# Altium footprint library User.PcbLib: 317 footprints (part 15 of 20)
Each footprint in its own frame and in the unit in brackets; x right, y up, seen from the top. Pads: shape width x height; smd on the part's side, far side on the other; paste and mask are expansions set on the pad; w line width, h text height; cw(c..) or ccw(c..) is an arc to the next point about the centre after c.
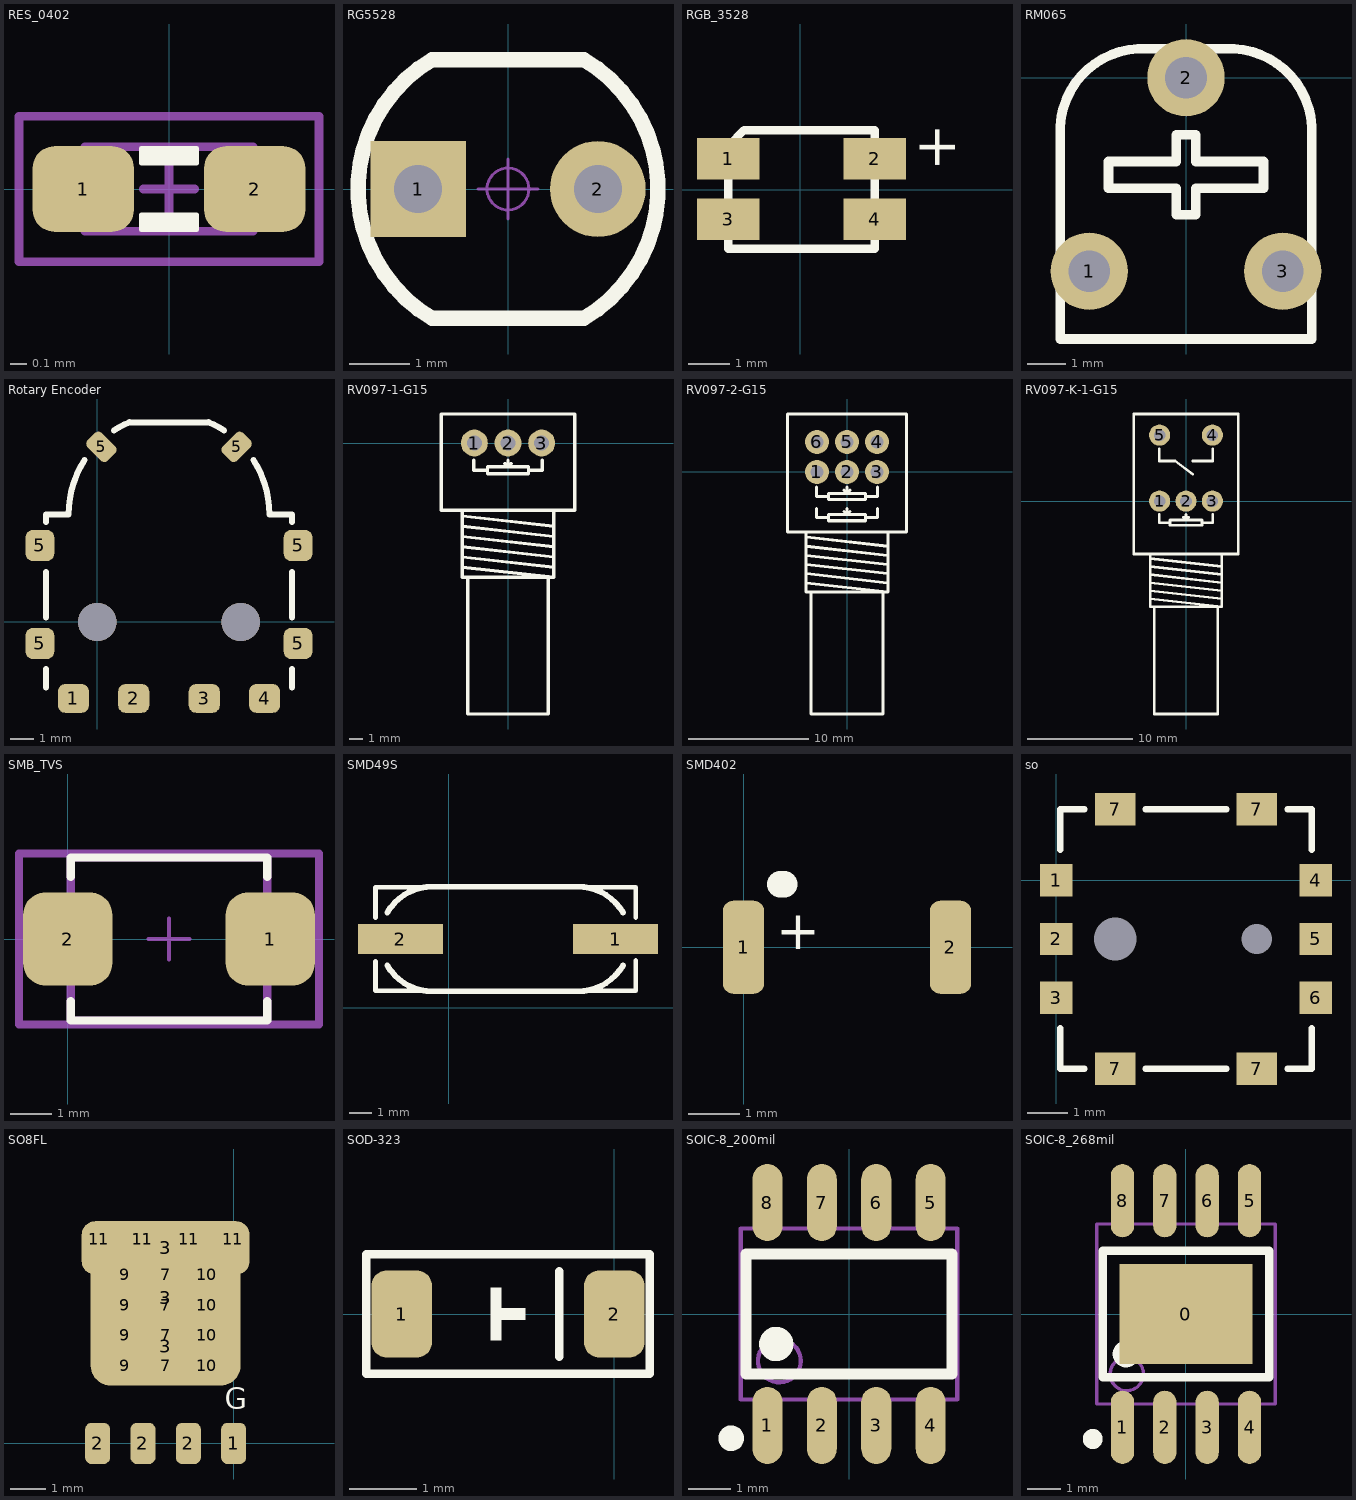
[diagram p14: the footprints below, top view; thin cyan lines are the x and y axes]

## RES_0402 [mil]
pads (2):
  rrect50% 23.62x20 smd: 1(-20,0) 2(20,0)
Top Overlay:
  region: -6.5,9.5 6.5,9.5 6.5,6 -6.5,6
  region: 6.5,-9.5 -6.5,-9.5 -6.5,-6 6.5,-6
  lines w1: -6.5,-9.5 -6.5,-6 6.5,-6 6.5,-9.5 -6.5,-9.5 ; -6.5,6 6.5,6 6.5,9.5 -6.5,9.5 -6.5,6
Mechanical 13:
  lines w2: -6,0 6,0 ; 0,-6 0,6 ; -19.69,-9.84 19.68,-9.84 19.68,9.84 -19.69,9.84 -19.69,-9.84
Mechanical 14:
  lines w2: -35,-17 -35,17 35,17 35,-17 -35,-17
3D body "RESC1005X03L.step": height 13.78, standoff 0, extent -19.68,-9.84 19.69,9.85

## RG5528 [mm] "LIght"
pads (2):
  rect 1.6x1.6 hole 0.8: 1(-1.5,0)
  round 1.6 hole 0.8: 2(1.5,0)
Top Overlay:
  lines w0.254: -1.27,-2.159 cw(c0,0) -1.27,2.159 1.27,2.159 cw(c0,0) 1.27,-2.159 -1.27,-2.159
Mechanical 15:
  circle w0.05: c0,0 r0.35
  lines w0.05: -0.5,0 0.5,0 ; 0,-0.5 0,0.5
3D body "RG5528.STEP": height 4.9, standoff -0.45, extent -2.5,-2.15 2.5,2.15

## RGB_3528 [mm]
pads (4):
  rect 1.5x1 smd: 1(-1.727,0.737) 2(1.778,0.737) 3(-1.727,-0.711) 4(1.778,-0.711)
Top Overlay:
  lines w0.2: -1.727,-1.422 1.778,-1.422 1.778,1.422 -1.346,1.422 -1.727,1.041 -1.727,-1.422
  text "+" at 3.709,0.436 h1
Mechanical 2:
  text "+" at 0.534,-0.33 h1
3D body "LED3528.step": height 1.8, standoff 0, extent -1.75,-1.4 1.75,1.4

## RM065 [mil] "蓝白可调电位器"
pads (3):
  round 80 hole 43.31: 1(-100,-200) 2(0,0) 3(100,-200)
Top Overlay:
  lines w10: -130,-270 130,-270 130,-50 ccw(c45,-55) 40,30 -40,30 ccw(c-45,-55) -130,-50 -130,-270 ; -80,-114.17 -80,-86.61 -10,-86.61 -10,-70 -10,-59.06 10,-59.06 10,-86.61 80,-86.61 80,-114.17 10,-114.17 10,-141.73 -10,-141.73 -10,-114.17 -80,-114.17
3D body "RM065.STEP": height 299.21, standoff -137.8, extent -127.95,-268.83 127.96,29.59

## Rotary Encoder [mm]
pads (10):
  rrect50% 1.3x1.2 smd: 1(-1,-3.2) 2(1.525,-3.2) 3(4.475,-3.2) 4(7,-3.2)
  rrect50% 1.2x1.3 smd: 5(-2.4,-0.9) 5(-2.4,3.2) 5(8.4,-0.9) 5(8.4,3.2)
  rrect50% 0.85x1.2 smd rot 45: 5(0.172,7.328)
  rrect50% 0.85x1.2 smd rot 135: 5(5.828,7.328)
via 0,0 diameter 1.6 hole 1.6
via 6,0 diameter 1.6 hole 1.6
Top Overlay:
  lines w0.254: -2.15,-2.75 -2.15,-1.977 ; -2.15,0.182 -2.15,2.098 ; -2.15,4.176 -2.15,4.5 -1.2,4.5 cw(c3,4.5) -0.533,6.771 ; 0.702,8.015 cw(c3,4.5) 1.345,8.36 ; 1.345,8.35 4.655,8.35 ; 4.655,8.36 cw(c3,4.5) 5.298,8.015 ; 6.533,6.771 cw(c3,4.5) 7.2,4.5 8.15,4.5 8.15,4.176 ; 8.15,-2.75 8.15,-1.977 ; 8.15,0.182 8.15,2.098
3D body "RE.step": height 4.06, standoff -0.44, extent -4.199,-3 10.199,11.75

## RV097-1-G15 [mm] "单路"
pads (3):
  round 2 hole 1.1: 1(-2.5,0) 2(0,0) 3(2.5,0)
Top Overlay:
  lines w0.254: -3.4,-9.238 3.4,-10 ; -3.4,-8.476 3.4,-9.238 ; -3.4,-7.714 3.4,-8.476 ; -3.4,-6.952 3.4,-7.714 ; -3.4,-6.19 3.4,-6.952 ; -3.4,-5.428 3.4,-6.19 ; -3.4,-5 -3.4,-10 3.4,-10 ; -3,-10 -3,-20.16 3,-20.16 3,-10 ; -2.54,-1.27 -2.54,-2.032 -1.524,-2.032 ; -0.254,-1.524 0,-1.778 ; 0,-1.27 0,-1.778 ; 0.254,-1.524 0,-1.778 ; 1.524,-2.032 2.54,-2.032 2.54,-1.27 ; 3.4,-5 3.4,-10 ; -4.953,-5 -4.953,2.159 4.953,2.159 4.953,-5 -4.953,-5 ; -1.524,-2.286 1.524,-2.286 1.524,-1.778 -1.524,-1.778 -1.524,-2.286
3D body "RV097-1-G15.STEP": height 11.25, standoff -2.95, extent -4.75,-20 4.75,2

## RV097-2-G15 [mm] "双路"
pads (6):
  round 2 hole 1.1: 1(-2.5,0) 2(0,0) 3(2.5,0) 4(2.5,2.5) 5(0,2.5) 6(-2.5,2.5)
Top Overlay:
  lines w0.254: -3.4,-9.238 3.4,-10 ; -3.4,-8.476 3.4,-9.238 ; -3.4,-7.714 3.4,-8.476 ; -3.4,-6.952 3.4,-7.714 ; -3.4,-6.19 3.4,-6.952 ; -3.4,-5.428 3.4,-6.19 ; -3.4,-5 -3.4,-10 3.4,-10 ; -3,-10 -3,-20.16 3,-20.16 3,-10 ; -2.54,-3.048 -2.54,-3.81 -1.524,-3.81 ; -2.54,-1.27 -2.54,-2.032 -1.524,-2.032 ; -0.254,-3.302 0,-3.556 ; -0.254,-1.524 0,-1.778 ; 0,-3.048 0,-3.556 ; 0,-1.27 0,-1.778 ; 0.254,-3.302 0,-3.556 ; 0.254,-1.524 0,-1.778 ; 1.524,-3.81 2.54,-3.81 2.54,-3.048 ; 1.524,-2.032 2.54,-2.032 2.54,-1.27 ; 3.4,-5 3.4,-10 ; -4.953,-5 4.953,-5 4.953,4.826 -4.953,4.826 -4.953,-5 ; -1.524,-4.064 -1.524,-3.556 1.524,-3.556 1.524,-4.064 -1.524,-4.064 ; -1.524,-2.286 -1.524,-1.778 1.524,-1.778 1.524,-2.286 -1.524,-2.286
3D body "RV097-2-G15.STEP": height 11.25, standoff -2.95, extent -4.75,-20 4.75,4.6

## RV097-K-1-G15 [mm] "带开关单路"
pads (5):
  round 2 hole 1.1: 1(-2.5,0) 2(0,0) 3(2.5,0) 4(2.5,6.25) 5(-2.5,6.25)
Top Overlay:
  lines w0.254: -3.4,-9.238 3.4,-10 ; -3.4,-8.476 3.4,-9.238 ; -3.4,-7.714 3.4,-8.476 ; -3.4,-6.952 3.4,-7.714 ; -3.4,-6.19 3.4,-6.952 ; -3.4,-5.428 3.4,-6.19 ; -3.4,-5 -3.4,-10 3.4,-10 ; -3,-10 -3,-20.16 3,-20.16 3,-10 ; -2.54,-1.27 -2.54,-2.032 -1.524,-2.032 ; -2.54,4.953 -2.54,3.81 -1.016,3.81 0.635,2.54 ; -0.254,-1.524 0,-1.778 ; 0,-1.27 0,-1.778 ; 0.254,-1.524 0,-1.778 ; 0.635,3.81 2.54,3.81 2.54,4.953 ; 1.524,-2.032 2.54,-2.032 2.54,-1.27 ; 3.4,-5 3.4,-10 ; -4.953,-5 4.953,-5 4.953,8.255 -4.953,8.255 -4.953,-5 ; -1.524,-2.286 1.524,-2.286 1.524,-1.778 -1.524,-1.778 -1.524,-2.286
3D body "RV097-K-1-G15.STEP": height 11.25, standoff -2.95, extent -4.75,-20 4.75,8

## SMB_TVS [mm]
pads (2):
  rrect50% 2.16x2.26 smd paste+0 mask+0: 1(4.9,0) 2(0,0)
Top Overlay:
  lines w0.2: 0.075,-1.505 0.075,-1.97 4.825,-1.97 4.825,-1.505 ; 0.075,1.505 0.075,1.97 4.825,1.97 4.825,1.505
Mechanical 10:
  lines w0.2: -1.18,-2.07 6.08,-2.07 6.08,2.07 -1.18,2.07 -1.18,-2.07
Mechanical 12:
  lines w0.2: 0.075,-1.97 4.825,-1.97 4.825,1.97 0.075,1.97 0.075,-1.97
Mechanical 15:
  lines w0.1: 1.95,0 2.95,0 ; 2.45,-0.5 2.45,0.5
  lines w0.2: -1.18,-2.07 6.08,-2.07 6.08,2.07 -1.18,2.07 -1.18,-2.07
3D body "Diode_Littelfuse_Inc_SMBJ28CA_eec.STEP": height 2.62, standoff 0, extent -0.25,-1.81 5.15,1.81

## SMD49S [mil]
pads (2):
  rect 146x51 smd: 1(287.32,118.11) 2(-82.68,118.11)
Top Overlay:
  lines w8: -125.68,80.11 -125.68,29.11 322.32,29.11 322.32,81.11 ; -125.68,155.11 -125.68,207.11 322.32,207.11 322.32,155.11
  lines w10: -105.25,72.48 ccw(c-27.68,118.11) -27.68,28.11 232.32,28.11 ; -105.25,163.74 cw(c-27.68,118.11) -27.68,208.11 222.32,208.11 cw(c222.32,118.11) 299.9,163.74 ; 222.32,28.11 ccw(c222.32,118.11) 299.9,72.48

## SMD402 [mm] "蜂鸣器"
pads (2):
  rrect50% 0.8x1.8 smd: 1(0,0) 2(4,0)
Top Overlay:
  lines w0.508: 0.711,1.219 0.787,1.219
  text "+" at 0.636,-0.28 h1.27
3D body "User Library-DET402.STEP": height 2.03, standoff -0.02, extent -0.45,-1.5 4.44,1.5

## so [mm]
pads (12):
  rect 0.8x0.8 smd: 1(0,0) 2(0,-1.45) 3(0,-2.9) 4(6.4,0) 5(6.4,-1.45) 6(6.4,-2.9)
  rect 1x0.8 smd: 7(1.45,-4.65) 7(1.45,1.75) 7(4.95,-4.65) 7(4.95,1.75)
  round 0 hole 1.05: ""(1.45,-1.45)
  round 0 hole 0.75: ""(4.95,-1.45)
Top Overlay:
  lines w0.152: 0.1,-3.65 0.1,-4.65 0.7,-4.65 ; 0.1,0.75 0.1,1.75 0.7,1.75 ; 2.2,-4.65 4.2,-4.65 ; 2.2,1.75 4.2,1.75 ; 5.7,-4.65 6.3,-4.65 6.3,-3.65 ; 5.7,1.75 6.3,1.75 6.3,0.75
3D body "SOQ.STEP": height 5, standoff -0.5, extent -0.122,-4.65 6.522,1.75

## SO8FL [mm]
pads (23):
  rrect50% 0.7x1.15 smd paste-0.05 mask+0.075: 1(0,0) 2(-3.81,0) 2(-2.54,0) 2(-1.27,0)
  rrect50% 4.2x2.2 smd paste-10 mask+0.075: 3(-1.905,2.725)
  rect 4.2x2.2 smd paste-10 mask+0.075: 3(-1.905,4.075)
  rrect50% 4.7x1.5 smd paste-10 mask+0.075: 3(-1.905,5.475)
  rect 0.9x0.6 on Top Paste: 7(-1.905,2.175) 7(-1.905,3.025) 7(-1.905,3.875) 7(-1.905,4.725) 9(-3.055,2.175) 9(-3.055,3.025) 9(-3.055,3.875) 9(-3.055,4.725) 10(-0.755,2.175) 10(-0.755,3.025) 10(-0.755,3.875) 10(-0.755,4.725)
  rect 0.6x0.9 on Top Paste: 11(-3.78,5.725) 11(-2.555,5.725) 11(-1.255,5.725) 11(-0.03,5.725)
Top Overlay:
  text "G" at -0.253,0.771 h1.02
3D body "User Library-DFN5x6_SO8FL.STEP": height 1.13, standoff 0, extent -4.48,-0.225 0.67,5.925

## SOD-323 [mm] "40V-1A"
pads (2):
  rrect50% 0.9x1.3 smd: 1(-3.167,0) 2(0,0)
Top Overlay:
  region: -1.837,0.394 -1.685,0.394 -1.685,0.089 -1.329,0.089 -1.329,-0.089 -1.685,-0.089 -1.685,-0.394 -1.837,-0.394
  lines w0.127: -0.821,-0.635 -0.821,0.635 ; -3.692,-0.889 0.525,-0.889 0.525,0.889 -3.692,0.889 -3.692,-0.889
3D body "123.stp": height 1.48, standoff 0.03, extent -3.506,-0.864 0.344,0.836

## SOIC-8_200mil [mm] "52mm"
pads (8):
  oval 0.7x1.8 smd: 1(-1.905,-2.6) 2(-0.635,-2.6) 3(0.635,-2.6) 4(1.905,-2.6) 5(1.905,2.6) 6(0.635,2.6) 7(-0.635,2.6) 8(-1.905,2.6)
Top Overlay:
  circle w0.3: c-2.75,-2.9 r0.15
  circle w0.4: c-1.7,-0.7 r0.2
  lines w0.254: -2.4,-1.4 2.4,-1.4 2.4,1.4 -2.4,1.4 -2.4,-1.4
Mechanical 13:
  circle w0.1: c-1.625,-1.095 r0.5
  lines w0.1: -2.525,-1.995 2.525,-1.995 2.525,1.995 -2.525,1.995 -2.525,-1.995

## SOIC-8_268mil [mm] "68mm"
pads (9):
  rect 4x3 smd: 0(0,0)
  oval 0.7x2.2 smd: 1(-1.905,-3.4) 2(-0.635,-3.4) 3(0.635,-3.4) 4(1.905,-3.4) 5(1.905,3.4) 6(0.635,3.4) 7(-0.635,3.4) 8(-1.905,3.4)
Top Overlay:
  circle w0.3: c-2.797,-3.75 r0.15
  circle w0.4: c-1.8,-1.2 r0.2
  lines w0.254: -2.5,-1.9 -2.5,1.9 2.5,1.9 2.5,-1.9 -2.5,-1.9
Mechanical 13:
  circle w0.1: c-1.775,-1.8 r0.5
  lines w0.1: -2.675,-2.7 -2.675,2.7 2.675,2.7 2.675,-2.7 -2.675,-2.7
3D body "SOIC8.STEP": height 2.3, standoff -0.02, extent -2.69,-4.247 2.69,4.146